# Altium footprint library VEGG_PcbLib_ALT.PcbLib: 140 footprints (part 9 of 9)
Each footprint in its own frame and in the unit in brackets; x right, y up, seen from the top. Pads: shape width x height; smd on the part's side, far side on the other; paste and mask are expansions set on the pad; w line width, h text height; cw(c..) or ccw(c..) is an arc to the next point about the centre after c.
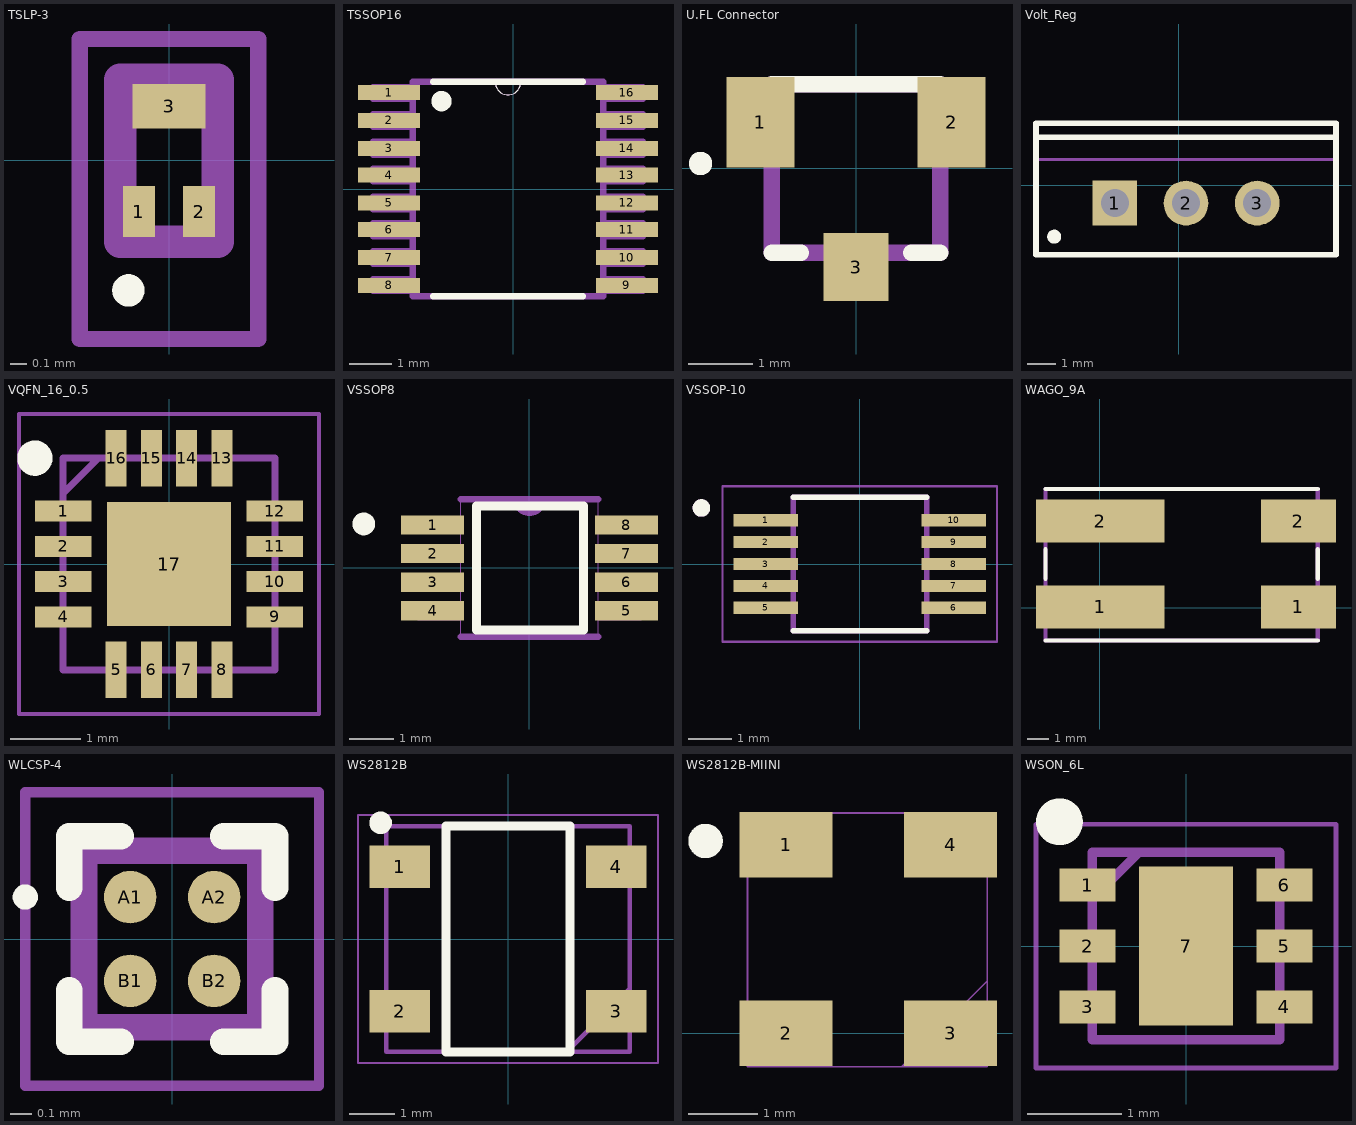
[diagram p8: the footprints below, top view; thin cyan lines are the x and y axes]

## TSLP-3 [mm] "TSLP-3 ESD"
pads (3):
  rect 0.2x0.315 smd: 1(-0.185,-0.318) 2(0.185,-0.318)
  rect 0.45x0.275 smd: 3(0,0.332)
Top Overlay:
  lines w0.1: -0.3,-0.803 ccw(c-0.25,-0.803) -0.2,-0.803 ccw(c-0.25,-0.803) -0.3,-0.803
Mechanical 15:
  lines w0.2: -0.3,-0.503 -0.3,0.497 0.3,0.497 0.3,-0.503 -0.3,-0.503
Mechanical 20:
  lines w0.1: -0.55,-1.103 -0.55,0.747 0.55,0.747 0.55,-1.103 -0.55,-1.103
3D body "User Library-PG-TSLP-3.STEP": height 0.37, standoff -0.08, extent -0.3,-0.5 0.3,0.5

## TSSOP16 [mil]
pads (16):
  rect 58x14 smd: 1(-116,90) 2(-116,64) 3(-116,38) 4(-116,13) 5(-116,-13) 6(-116,-38) 7(-116,-64) 8(-116,-90) 9(106,-90) 10(106,-64) 11(106,-38) 12(106,-13) 13(106,13) 14(106,38) 15(106,64) 16(106,90)
Top Overlay:
  circle w10: c-67,82 r4.47
  lines w0: -17,100 ccw(c-5,100) 7,100
  lines w6: -75,-100 65,-100 ; -75,100 -17,100 7,100 65,100
Mechanical 1:
  lines w0: -17,100 ccw(c-5,100) 7,100
  lines w6: -131,-95 -94,-95 -94,-84 -131,-84 -131,-95 ; -131,-70 -94,-70 -94,-58 -131,-58 -131,-70 ; -131,-44 -94,-44 -94,-32 -131,-32 -131,-44 ; -131,-19 -94,-19 -94,-7 -131,-7 -131,-19 ; -131,7 -94,7 -94,19 -131,19 -131,7 ; -131,32 -94,32 -94,44 -131,44 -131,32 ; -131,58 -94,58 -94,70 -131,70 -131,58 ; -131,84 -94,84 -94,95 -131,95 -131,84 ; -94,-100 -94,100 -17,100 7,100 84,100 84,-100 -94,-100 ; 84,-95 121,-95 121,-84 84,-84 84,-95 ; 84,-70 121,-70 121,-58 84,-58 84,-70 ; 84,-44 121,-44 121,-32 84,-32 84,-44 ; 84,-19 121,-19 121,-7 84,-7 84,-19 ; 84,7 121,7 121,19 84,19 84,7 ; 84,32 121,32 121,44 84,44 84,32 ; 84,58 121,58 121,70 84,70 84,58 ; 84,84 121,84 121,95 84,95 84,84
3D body "User Library-TSSOP-16 5_1x4_4.STEP": height 41.69, standoff -1.62, extent -125.98,-100.38 125.99,100.4

## U.FL Connector [mm] "Antenna 2.4 Ghz Female connector"
pads (3):
  rect 1.05x1.4 smd: 1(-1.475,0.711) 2(1.475,0.711)
  rect 1x1.05 smd: 3(0,-1.525)
Top Overlay:
  circle w0.254: c-2.401,0.074 r0.054
  lines w0.254: -1.3,-1.3 -0.85,-1.3 ; -1.3,1.3 1.3,1.3 ; 0.85,-1.3 1.3,-1.3
Mechanical 15:
  lines w0.254: -1.3,-1.3 1.3,-1.3 1.3,1.3 -1.3,1.3 -1.3,-1.3
3D body "u.Fl Antenna Connector - 523-A-1JB.SLDPRT": height 1.25, standoff 0, extent -1.499,-1.829 1.501,1.271

## Volt_Reg [mm] "7805 thorugh hole"
pads (3):
  rect 1.6x1.6 hole 1: 1(-2.286,-0.635)
  round 1.6 hole 1: 2(0.254,-0.635) 3(2.794,-0.635)
Top Overlay:
  circle w0.25: c-4.446,-1.835 r0.125
  lines w0.2: -5.096,1.715 5.604,1.715 ; -5.096,-2.485 -5.096,2.215 5.604,2.215 5.604,-2.485 -5.096,-2.485
Mechanical 13:
  lines w0.1: -5.096,0.915 5.604,0.915 ; -5.096,-2.485 5.604,-2.485 5.604,2.215 -5.096,2.215 -5.096,-2.485
Mechanical 15:
  lines w0.1: -0.246,-0.635 0.754,-0.635 ; 0.254,-1.135 0.254,-0.135
3D body: height 12.9, standoff 4, extent -5.146,-2.535 5.654,2.265
3D body: height 19.3, standoff 12.9, extent -5.095,0.916 5.603,2.214

## VQFN_16_0.5 [mm]
pads (17):
  rect 0.8x0.3 smd: 1(-1.5,0.75) 2(-1.5,0.25) 3(-1.5,-0.25) 4(-1.5,-0.75) 9(1.5,-0.75) 10(1.5,-0.25) 11(1.5,0.25) 12(1.5,0.75)
  rect 0.3x0.8 smd: 5(-0.75,-1.5) 6(-0.25,-1.5) 7(0.25,-1.5) 8(0.75,-1.5) 13(0.75,1.5) 14(0.25,1.5) 15(-0.25,1.5) 16(-0.75,1.5)
  rect 1.75x1.75 smd: 17(0,0)
Top Overlay:
  circle w0.25: c-1.9,1.5 r0.125
Mechanical 13:
  lines w0.1: -1.5,1 -1,1.5 ; -1.5,-1.5 -1.5,1.5 1.5,1.5 1.5,-1.5 -1.5,-1.5
Mechanical 15:
  lines w0.05: -2.125,-2.125 -2.125,2.125 2.125,2.125 2.125,-2.125 -2.125,-2.125
3D body "TPS62142RGTR.stp": height 1, standoff 0, extent -1.55,-1.55 1.55,1.55

## VSSOP8 [mil]
pads (8):
  rect 56x17 smd: 1(-86,38) 2(-86,12.67) 3(-86,-12.67) 4(-86,-38) 5(86,-38) 6(86,-12.67) 7(86,12.67) 8(86,38)
Top Overlay:
  circle w10: c-147,39 r5.1
  lines w8: -47,-55 47,-55 48,-55 48,55 -47,55 -47,-55
Mechanical 8:
  lines w0: -12,61 ccw(c0,61) 12,61 ; -12,61 12,61 ; -12,61 -61,61 -61,-61 61,-61 61,61 12,61 ; -99,-46 -99,-31 -61,-31 -61,-46 -99,-46 ; -99,-20 -99,-5 -61,-5 -61,-20 -99,-20 ; -99,5 -99,20 -61,20 -61,5 -99,5 ; -99,31 -99,46 -61,46 -61,31 -99,31 ; 61,-46 61,-31 99,-31 99,-46 61,-46 ; 61,-20 61,-5 99,-5 99,-20 61,-20 ; 61,5 61,20 99,20 99,5 61,5 ; 61,31 61,46 99,46 99,31 61,31
Mechanical 16:
  lines w6: -61,-61 61,-61 ; -61,61 -12,61 ; 61,61 12,61 ; -12,61 ccw(c0,61) 12,61 ; -12,61 12,61
3D body "INA225.stp": height 43.31, standoff 0, extent -96.5,-59 96.5,59

## VSSOP-10 [mm] "op-amp-dcload"
pads (10):
  rect 1.47x0.28 smd: 1(-2.15,1) 2(-2.15,0.5) 3(-2.15,0) 4(-2.15,-0.5) 5(-2.15,-1) 6(2.15,-1) 7(2.15,-0.5) 8(2.15,0) 9(2.15,0.5) 10(2.15,1)
Top Overlay:
  circle w0.2: c-3.62,1.28 r0.1
  lines w0.127: -1.525,-1.525 1.525,-1.525 ; -1.525,1.525 1.525,1.525
Mechanical 4:
  circle w0.2: c-3.62,1.28 r0.1
  circle w0.2: c-3.62,1.28 r0.1
  lines w0.127: -1.525,-1.525 -1.525,1.525 ; -1.525,-1.525 1.525,-1.525 ; -1.525,-1.525 -1.525,1.525 ; -1.525,-1.525 1.525,-1.525 ; -1.525,1.525 1.525,1.525 ; -1.525,1.525 1.525,1.525 ; 1.525,-1.525 1.525,1.525 ; 1.525,-1.525 1.525,1.525
Mechanical 16:
  lines w0.05: -3.135,-1.775 -3.135,1.775 3.135,1.775 3.135,-1.775 -3.135,-1.775
3D body "msop-10.SLDPRT": height 1.15, standoff 0, extent -2.45,-1.525 2.45,1.475

## WAGO_9A [mm] "AC 230V mains connector"
pads (4):
  rect 6x2 smd: 1(0.018,0.032) 2(0.018,4.032)
  rect 3.5x2 smd: 1(9.268,0.032) 2(9.268,4.032)
Top Overlay:
  lines w0.2: -2.54,-1.535 10.16,-1.535 ; -2.54,1.348 -2.54,2.716 ; -2.54,5.535 10.16,5.535 ; 10.16,1.348 10.16,2.716
Mechanical 15:
  lines w0.2: -2.54,-1.535 10.16,-1.535 10.16,5.535 -2.54,5.535 -2.54,-1.535
3D body "2060-452_998-404.stp": height 5.48, standoff -0.02, extent -2.359,-1.905 10.741,5.995

## WLCSP-4 [mm]
pads (4):
  round 0.25 smd: A1(-0.2,0.2) A2(0.2,0.2) B1(-0.2,-0.2) B2(0.2,-0.2)
Top Overlay:
  circle w0.06: c-0.7,0.2 r0.03
  lines w0.127: -0.49,-0.245 -0.49,-0.49 -0.245,-0.49 ; -0.49,0.245 -0.49,0.49 -0.245,0.49 ; 0.245,-0.49 0.49,-0.49 0.49,-0.245 ; 0.245,0.49 0.49,0.49 0.49,0.245
Mechanical 4:
  lines w0.127: -0.42,-0.42 -0.42,0.42 ; -0.42,-0.42 0.42,-0.42 ; -0.42,-0.42 -0.42,0.42 ; -0.42,-0.42 0.42,-0.42 ; -0.42,0.42 0.42,0.42 ; -0.42,0.42 0.42,0.42 ; 0.42,-0.42 0.42,0.42 ; 0.42,-0.42 0.42,0.42
Mechanical 16:
  lines w0.05: -0.7,-0.7 -0.7,0.7 0.7,0.7 0.7,-0.7 -0.7,-0.7
3D body "User Library-WLCSP4.X_T": height 0.42, standoff -0.05, extent -0.337,-0.337 0.338,0.338

## WS2812B [mm] "RGB LED"
pads (4):
  rect 1.35x0.95 smd: 1(-2.4,1.6) 2(-2.4,-1.6) 3(2.4,-1.6) 4(2.4,1.6)
Top Overlay:
  circle w0.25: c-2.825,2.575 r0.125
  lines w0.2: -1.375,-2.5 -1.375,2.5 1.375,2.5 1.375,-2.5 -1.375,-2.5
Mechanical 15:
  lines w0.1: 1.325,-2.475 2.675,-1.125 ; -2.7,-2.5 -2.7,2.5 2.7,2.5 2.7,-2.5 -2.7,-2.5
Mechanical 20:
  lines w0.05: -3.325,-2.75 -3.325,2.75 3.325,2.75 3.325,-2.75 -3.325,-2.75

## WS2812B-MIINI [mm]
pads (4):
  rect 1.35x0.95 smd: 1(2.413,2.743) 2(2.413,0) 3(4.8,0) 4(4.8,2.743)
Top Overlay:
  circle w0.25: c1.245,2.794 r0.125
Mechanical 4:
  lines w0.025: 4.089,-0.483 5.334,0.762 ; 1.854,-0.483 5.334,-0.483 5.334,3.2 1.854,3.2 1.854,-0.483
3D body: height 0.25, standoff 0, extent 5.486,-0.483 5.486,-0.483
3D body: height 0.25, standoff 0, extent 1.727,3.226 1.727,3.226
3D body: height 0.25, standoff 0, extent 1.727,3.226 1.727,3.226
3D body: height 1.95, standoff 0, extent 1.854,-0.483 5.334,3.2

## WSON_6L [mm] "TPS62291DRVR"
pads (7):
  rect 0.6x0.35 smd: 1(-1.05,0.65) 2(-1.05,0) 3(-1.05,-0.65) 4(1.05,-0.65) 5(1.05,0) 6(1.05,0.65)
  rect 1x1.7 smd: 7(0,0)
Top Overlay:
  circle w0.25: c-1.35,1.325 r0.125
Mechanical 13:
  lines w0.1: -1,0.5 -0.5,1 ; -1,-1 1,-1 1,1 -1,1 -1,-1
Mechanical 15:
  lines w0.05: -1.6,-1.3 1.6,-1.3 1.6,1.3 -1.6,1.3 -1.6,-1.3
3D body "TPS62291DRVR.stp": height 0.8, standoff 0, extent -1.05,-1 1.05,1